# Altium footprint library XU-GENARAL PCB .PcbLib: 1176 footprints (part 54 of 75)
Each footprint in its own frame and in the unit in brackets; x right, y up, seen from the top. Pads: shape width x height; smd on the part's side, far side on the other; paste and mask are expansions set on the pad; w line width, h text height; cw(c..) or ccw(c..) is an arc to the next point about the centre after c.
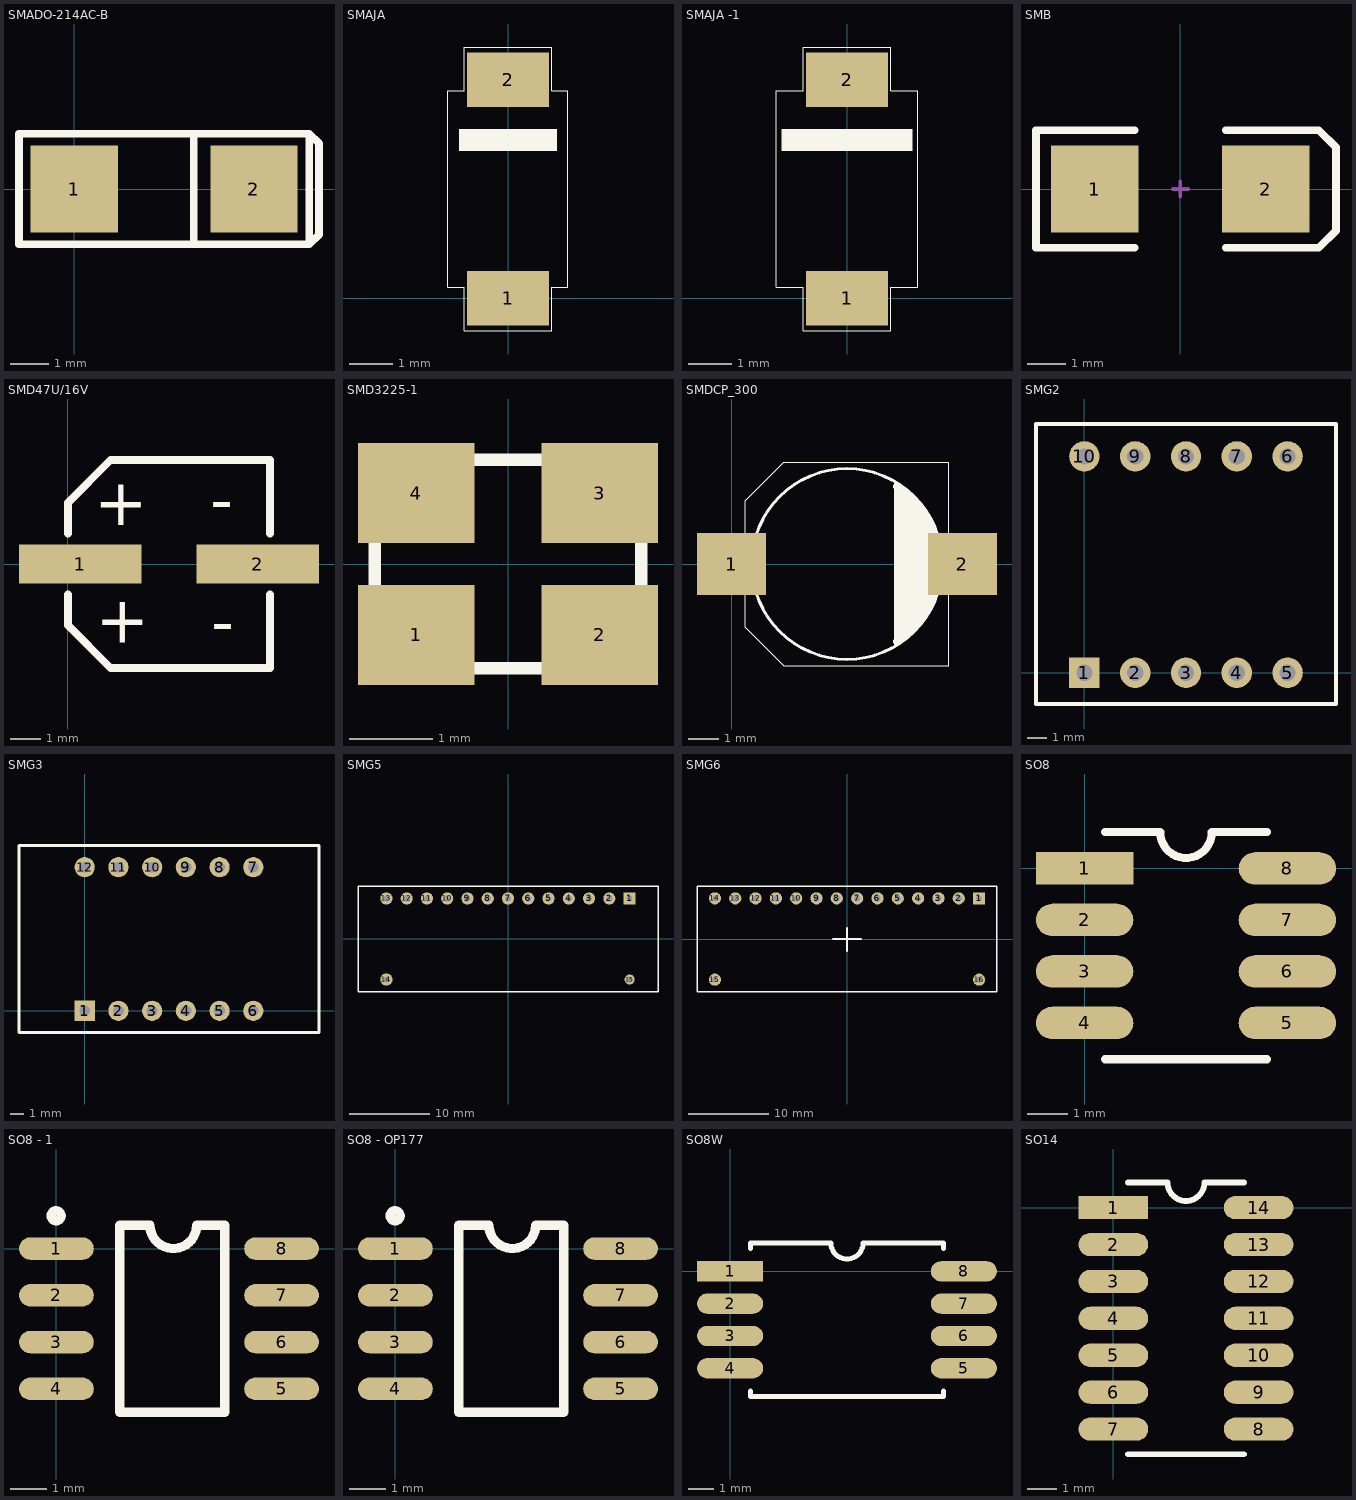
[diagram p53: the footprints below, top view; thin cyan lines are the x and y axes]

## SMADO-214AC-B [mil]
pads (2):
  rect 90x90 smd: 1(0,0) 2(185,0)
Top Overlay:
  lines w8: 123,-57 123,57 ; 242,-57 -57,-57 -57,57 242,57 ; 242,-57 252,-47 252,47 242,57 ; 242,-57 242,57

## SMAJA [mil]
height 43.31
pads (2):
  rect 75x50 smd: 1(0,0) 2(0,200)
Top Overlay:
  region: 45,135 45,155 -45,155 -45,135
  lines w1: -55,10 -40,10 -40,-30 40,-30 40,10 55,10 55,190 40,190 40,230 -40,230 -40,190 -55,190 -55,10

## SMAJA -1 [mil]
height 267.72
pads (2):
  rect 75x50 smd: 1(0,0) 2(0,200)
Top Overlay:
  region: 60,135 60,155 -60,155 -60,135
  lines w1: -65,10 -40,10 -40,-30 40,-30 40,10 65,10 65,190 40,190 40,230 -40,230 -40,190 -65,190 -65,10

## SMB [mm] "DO-214-AA/SMB; 2 C-Bend Leads; Body 5.3 x 3.6 mm, inc. leads (LxW)"
height 2.54
pads (2):
  rect 2.3x2.3 smd: 1(-2.25,0) 2(2.25,0)
Top Overlay:
  lines w0.2: -1.2,-1.55 -3.8,-1.55 -3.8,1.55 -1.2,1.55 ; 1.2,-1.55 3.65,-1.55 4.1,-1.1 4.1,1.1 3.65,1.55 1.2,1.55
Mechanical 1:
  lines w0.1: -0.2,0 0.2,0 ; 0,-0.2 0,0.2

## SMD47U/16V [mm]
pads (2):
  rect 4x1.27 smd: 1(0.4,0) 2(6.2,0)
Top Overlay:
  lines w0.254: 0,-1 0,-2 1.4,-3.4 6.6,-3.4 6.6,-1 ; 0,1 0,2 1.4,3.4 6.6,3.4 6.6,1
  text "+" at 0.914,-2.565 h1.52
  text "+" at 0.864,1.27 h1.52
  text "-" at 4.648,1.372 h1.52
  text "-" at 4.674,-2.616 h1.52

## SMD3225-1 [mm]
pads (4):
  rect 1.4x1.2 smd: 1(-1.1,-0.85) 2(1.1,-0.85) 3(1.1,0.85) 4(-1.1,0.85)
Top Overlay:
  lines w0.15: -1.6,-1.25 -1.6,1.25 1.6,1.25 1.6,-1.25 -1.6,-1.25

## SMDCP_300 [mil]
pads (2):
  rect 90x80 smd: 1(0,0) 2(300,0)
Top Overlay:
  circle w4: c150,0 r124
  rectangle: 212,-85 240,85
  rectangle: 240,-55 260,55
  rectangle: 245,-35 270,35
  rectangle: 240,55 250,70
  rectangle: 240,-75 250,-55
  rectangle: 212,85 230,95
  rectangle: 212,-95 230,-85
  rectangle: 212,-100 220,-95
  rectangle: 212,95 220,100
  rectangle: 240,70 245,75
  rectangle: 250,-65 255,-55
  rectangle: 250,55 255,65
  rectangle: 260,-45 265,-35
  rectangle: 260,35 265,45
  lines w1: 212,-107.39 212,107.39 ; 18,-82 18,82 68,132 282,132 282,-132 68,-132 18,-82
  lines w10: 215,-100.87 ccw(c150,0) 215,100.87

## SMG2 [mil]
pads (10):
  rect 60x60 hole 32: 1(0,0)
  round 60 hole 32: 2(100,0) 3(200,0) 4(300,0) 5(400,0) 6(400,425.98) 7(300,425.98) 8(200,425.98) 9(100,425.98) 10(0,425.98)
Top Overlay:
  lines w8: -95.28,-61.42 495.28,-61.42 495.28,489.76 -95.28,489.76 -95.28,-61.42

## SMG3 [mil]
pads (12):
  rect 60x60 hole 32: 1(0,0)
  round 60 hole 32: 2(100,0) 3(200,0) 4(300,0) 5(400,0) 6(500,0) 7(500,425.98) 8(400,425.98) 9(300,425.98) 10(200,425.98) 11(100,425.98) 12(0,425.98)
Top Overlay:
  lines w8: -194.88,-64.57 694.88,-64.57 694.88,490.55 -194.88,490.55 -194.88,-64.57

## SMG5 [mil]
pads (15):
  rect 60x60 hole 30: 1(599.82,199.74)
  round 60 hole 30: 2(499.82,199.74) 3(399.82,199.74) 4(299.82,199.74) 5(199.82,199.74) 6(99.82,199.74) 7(-0.18,199.74) 8(-100.18,199.74) 9(-200.18,199.74) 10(-300.18,199.74) 11(-400.18,199.74) 12(-500.18,199.74) 13(-600.18,199.74) 14(-600.18,-200.26)
  round 50 hole 30: 15(599.82,-200.26)
Top Overlay:
  lines w7: -740.18,-260.26 739.82,-260.26 739.82,-140.26 739.82,259.74 -720.18,259.74 -740.18,259.74 -740.18,-140.26 -740.18,-260.26

## SMG6 [mil]
pads (16):
  rect 60x60 hole 30: 1(650,200)
  round 60 hole 30: 2(550,200) 3(450,200) 4(350,200) 5(250,200) 6(150,200) 7(50,200) 8(-50.66,200) 9(-150,200) 10(-250,200) 11(-350,200) 12(-450,200) 13(-550,200) 14(-650,200) 15(-650,-200) 16(650,-200)
Top Overlay:
  lines w7: -704.66,260 -684.66,260 ; -738.19,-260 738.19,-260 738.19,260 -738.19,260 -738.19,-260
  lines w10: -69.88,0 68.9,0 ; 0,-58.07 0,53.15

## SO8 [mm]
pads (8):
  rect 2.4x0.8 smd: 1(0,0)
  oval 2.4x0.8 smd: 2(0,-1.27) 3(0,-2.54) 4(0,-3.81) 5(5,-3.81) 6(5,-2.54) 7(5,-1.27) 8(5,0)
Top Overlay:
  lines w0.2: 0.5,-4.705 4.5,-4.705 ; 0.5,0.895 1.865,0.895 ccw(c2.5,0.895) 3.135,0.895 4.5,0.895

## SO8 - 1 [mil]
height 43.31
pads (8):
  oval 80x24 smd: 1(0,0) 2(0,-50) 3(0,-100) 4(0,-150) 5(240.75,-150) 6(240.75,-100) 7(240.75,-50) 8(240.75,0)
Top Overlay:
  circle w10: c-0.3,35 r5.3
  lines w10: 67.87,-175 180,-175 180,25 150,25 cw(c125,25) 100,25 67.87,25 67.87,-175

## SO8 - OP177 [mil]
height 43.31
pads (8):
  oval 80x24 smd: 1(0,0) 2(0,-50) 3(0,-100) 4(0,-150) 5(240.75,-150) 6(240.75,-100) 7(240.75,-50) 8(240.75,0)
Top Overlay:
  circle w10: c-0.3,35 r5.3
  lines w10: 67.87,-175 180,-175 180,25 150,25 cw(c125,25) 100,25 67.87,25 67.87,-175

## SO8W [mm]
pads (8):
  rect 2.6x0.8 smd: 1(0,0)
  oval 2.6x0.8 smd: 2(0,-1.27) 3(0,-2.54) 4(0,-3.81) 5(9.2,-3.81) 6(9.2,-2.54) 7(9.2,-1.27) 8(9.2,0)
Top Overlay:
  lines w0.2: 0.8,-4.71 0.8,-4.93 8.4,-4.93 8.4,-4.71 ; 0.8,0.9 0.8,1.12 3.965,1.12 ccw(c4.6,1.12) 5.235,1.12 8.4,1.12 8.4,0.9

## SO14 [mm]
pads (14):
  rect 2.4x0.8 smd: 1(0,0)
  oval 2.4x0.8 smd: 2(0,-1.27) 3(0,-2.54) 4(0,-3.81) 5(0,-5.08) 6(0,-6.35) 7(0,-7.62) 8(5,-7.62) 9(5,-6.35) 10(5,-5.08) 11(5,-3.81) 12(5,-2.54) 13(5,-1.27) 14(5,0)
Top Overlay:
  lines w0.2: 0.5,-8.485 4.5,-8.485 ; 0.5,0.865 1.865,0.865 ccw(c2.5,0.865) 3.135,0.865 4.5,0.865